# Altium footprint library Electronic Devices_LIB.PcbLib: 410 footprints (part 10 of 26)
Each footprint in its own frame and in the unit in brackets; x right, y up, seen from the top. Pads: shape width x height; smd on the part's side, far side on the other; paste and mask are expansions set on the pad; w line width, h text height; cw(c..) or ccw(c..) is an arc to the next point about the centre after c.
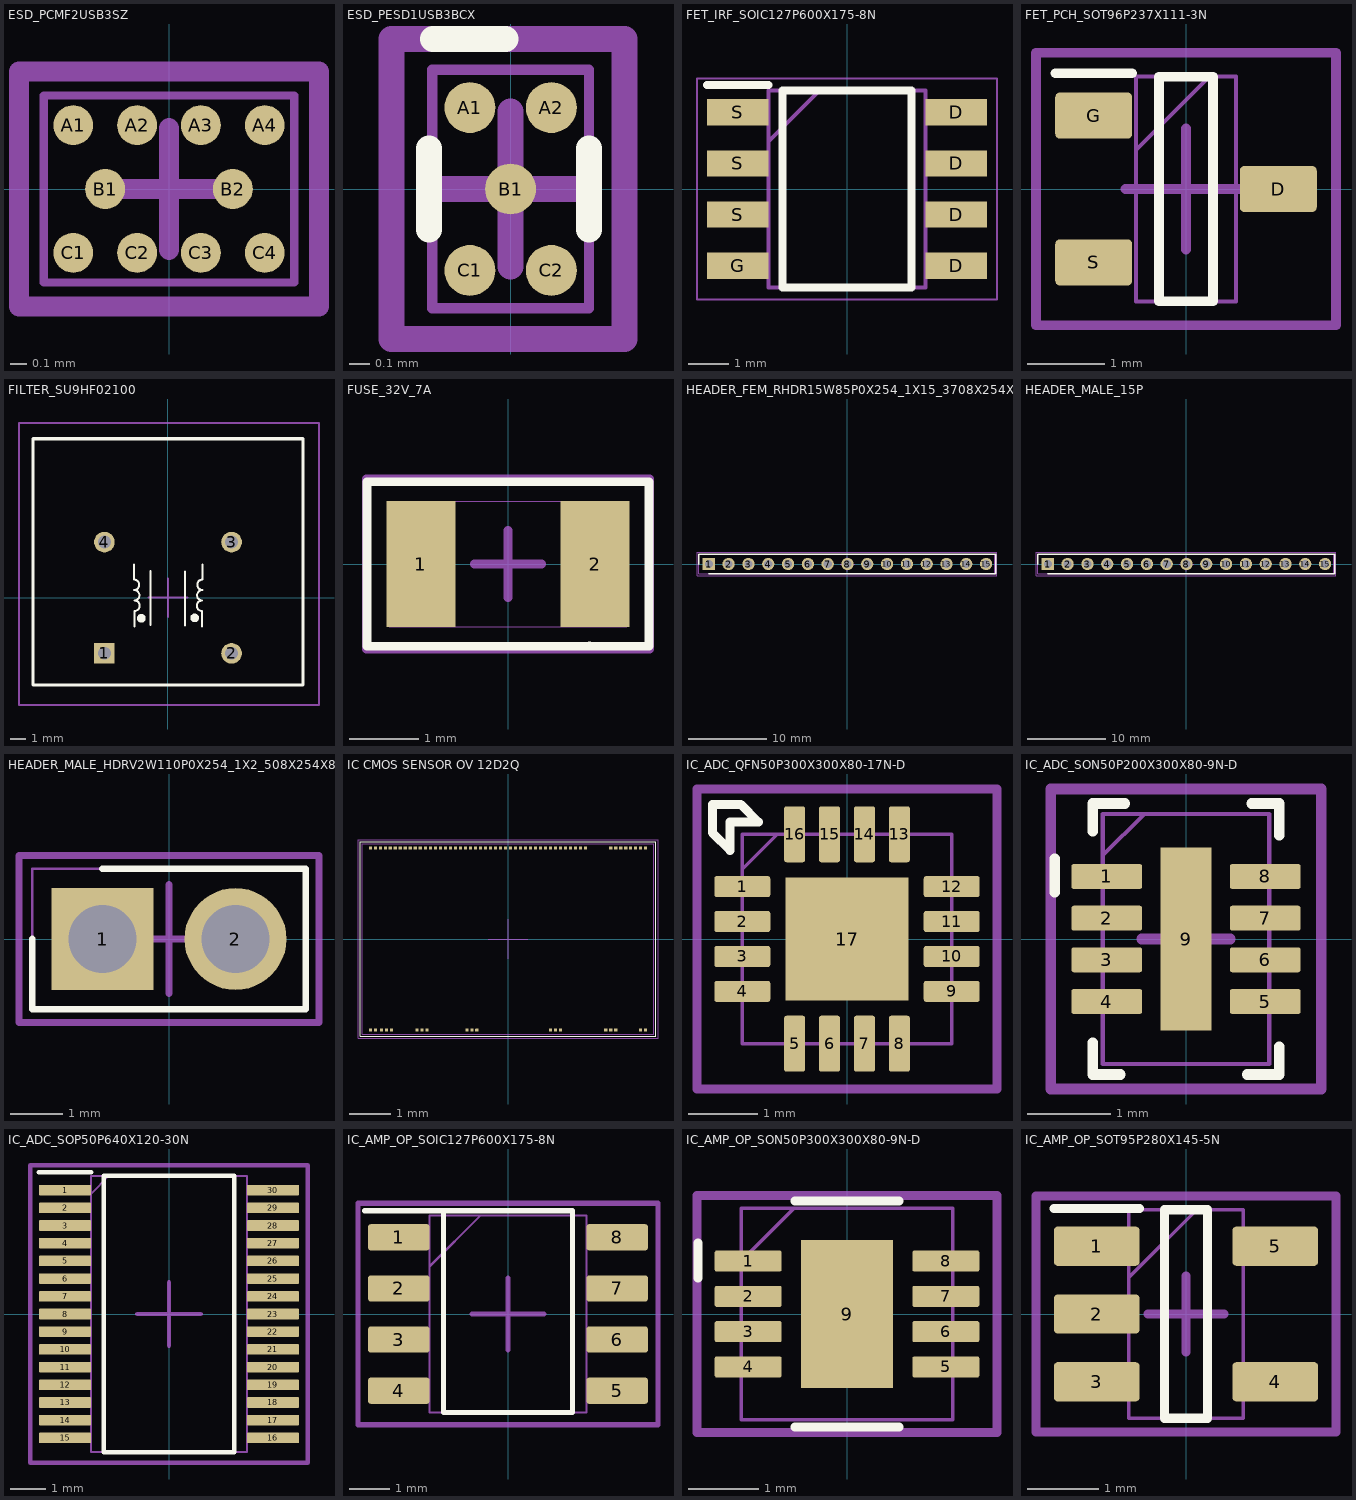
[diagram p9: the footprints below, top view; thin cyan lines are the x and y axes]

## ESD_PCMF2USB3SZ [mm]
pads (10):
  round 0.25 smd: A1(-0.6,0.4) A2(-0.2,0.4) A3(0.2,0.4) A4(0.6,0.4) B1(-0.4,0) B2(0.4,0) C1(-0.6,-0.4) C2(-0.2,-0.4) C3(0.2,-0.4) C4(0.6,-0.4)
Top Assembly:
  lines w0.051: -0.785,-0.585 0.785,-0.585 0.785,0.585 -0.785,0.585 -0.785,-0.585
  text ".Designator" at -2.388,-0.136 h0.51
Top Courtyard:
  lines w0.127: -0.381,0 0,0 ; 0,-0.381 0,0 ; 0,0.381 0,0 ; 0.381,0 0,0 ; -0.94,-0.737 -0.94,0.737 0.94,0.737 0.94,-0.737 -0.94,-0.737
3D body "PCMF2USB3SZ.stp": height 0.7, standoff 0, extent -0.785,-0.585 0.785,0.585

## ESD_PESD1USB3BCX [mm]
pads (5):
  round 0.25 smd: A1(-0.2,0.4) A2(0.2,0.4) B1(0,0) C1(-0.2,-0.4) C2(0.2,-0.4)
Top Overlay:
  lines w0.127: -0.4,-0.2 -0.4,0.2 ; -0.381,0.737 -0.025,0.737 ; 0.385,-0.2 0.385,0.2
Top Assembly:
  lines w0.051: -0.385,-0.585 0.385,-0.585 0.385,0.585 -0.385,0.585 -0.385,-0.585
  text ".Designator" at -2.388,-0.136 h0.51
Top Courtyard:
  lines w0.127: -0.381,0 0,0 ; 0,-0.381 0,0 ; 0,0.381 0,0 ; 0.381,0 0,0 ; -0.584,-0.737 0.559,-0.737 0.559,0.737 -0.584,0.737 -0.584,-0.737
3D body "PCMF1USB3SZ.stp": height 0.57, standoff 0, extent -0.385,-0.585 0.385,0.585

## FET_IRF_SOIC127P600X175-8N [mm]
pads (8):
  rect 1.525x0.65 smd: D(2.712,-1.905) D(2.712,-0.635) D(2.712,0.635) D(2.712,1.905) G(-2.712,-1.905) S(-2.712,-0.635) S(-2.712,0.635) S(-2.712,1.905)
Top Overlay:
  lines w0.2: -3.475,2.58 -1.95,2.58 ; -1.6,-2.45 -1.6,2.45 1.6,2.45 1.6,-2.45 -1.6,-2.45
Top 3D Body:
  lines w0.1: -1.95,1.18 -0.68,2.45 ; -1.95,-2.45 -1.95,2.45 1.95,2.45 1.95,-2.45 -1.95,-2.45
Mechanical 15:
  lines w0.05: -3.725,-2.75 -3.725,2.75 3.725,2.75 3.725,-2.75 -3.725,-2.75
3D body "NE555DR.stp": height 1.75, standoff 0, extent -3,-2.45 3,2.45

## FET_PCH_SOT96P237X111-3N [mm] "SOT-23-3 (TO-236)"
height 1.11
pads (3):
  rrect20% 1x0.6 smd: D(1.2,0) G(-1.2,0.955) S(-1.2,-0.955)
Top Overlay:
  lines w0.127: -1.7,1.505 -0.7,1.505 ; -0.35,-1.46 -0.35,1.46 0.35,1.46 0.35,-1.46 -0.35,-1.46
Top Assembly:
  lines w0.051: -0.65,0.505 0.305,1.46 ; -0.65,-1.46 -0.65,1.46 0.65,1.46 0.65,-1.46 -0.65,-1.46
  text ".Designator" at -2.438,-0.161 h0.51
Top Courtyard:
  lines w0.127: -0.787,0 0,0 ; 0,-0.787 0,0 ; 0,0.787 0,0 ; 0.787,0 0,0 ; -1.95,-1.77 -1.95,1.77 1.95,1.77 1.95,-1.77 -1.95,-1.77
3D body "NTR1P02T1G.stp": height 1.11, standoff 0, extent -1.185,-1.46 1.185,1.46

## FILTER_SU9HF02100 [mm]
pads (4):
  rect 1.3x1.3 hole 0.8: 1(-4,-3.5)
  round 1.3 hole 0.8: 2(4,-3.5) 3(4,3.5) 4(-4,3.5)
Top Overlay:
  circle w0.254: c-1.676,-1.295 r0.144
  circle w0.254: c1.676,-1.27 r0.144
  lines w0.127: -2.141,2.082 -2.141,1.142 cw(c-2.141,0.812) -2.125,0.482 cw(c-2.125,0.152) -2.108,-0.178 cw(c-2.108,-0.508) -2.092,-0.838 ; -2.108,-1.803 -2.108,-0.864 ; -1.092,-1.702 -1.092,1.676 ; 1.067,-1.74 1.067,1.638 ; 2.126,-0.837 cw(c2.143,-0.508) 2.143,-0.177 cw(c2.159,0.152) 2.159,0.483 cw(c2.175,0.812) 2.175,1.143 2.175,2.082 ; 2.143,-1.803 2.143,-0.863
  lines w0.2: -8.5,-5.5 -8.5,10 8.5,10 8.5,-5.5 -8.5,-5.5
Top Assembly:
  lines w0.051: -8.5,-5.5 8.5,-5.5 8.5,10 -8.5,10 -8.5,-5.5
  text ".Designator" at -2.654,0.784 h0.51
Top Courtyard:
  lines w0.127: -1.219,0 0,0 ; 0,-1.219 0,0 ; 0,1.219 0,0 ; 1.219,0 0,0 ; -9.373,-6.756 -9.373,11 9.5,11 9.5,-6.756 -9.373,-6.756
3D body "SU9HF-02100.stp": height 11.72, standoff -4.78, extent -8.499,-5.5 8.501,10.001

## FUSE_32V_7A [mil] "FUSE_3P4X1P8"
pads (2):
  rect 39x71 smd: 1(-49.21,0) 2(49.21,0)
Top Overlay:
  lines w5: 45.28,-46.44 79.71,-46.44 79.71,46.44 45.28,46.44 ; 46.06,-46.36 -79.71,-46.44 -79.71,46.44 47.83,46.46
Top Assembly:
  lines w0.01: -66.93,-35.43 66.93,-35.43 66.93,35.43 -66.93,35.43 -66.93,-35.43
  text ".Designator" at -103,-10.34 h20
Top Courtyard:
  lines w1: -10,0 10,0 ; 0,-10 0,10
  lines w5: -19,0 0,0 ; 0,-19 0,0 ; 0,19 0,0 ; 19,0 0,0 ; -80,-48 80,-48 80,48 -80,48 -80,-48
3D body "0440007.WR.stp": height 34.02, standoff 0, extent -62.56,-31.09 63.42,31.12

## HEADER_FEM_RHDR15W85P0X254_1X15_3708X254X850P [mm]
pads (15):
  rect 1.575x1.575 hole 1.05: 1(-17.78,0)
  round 1.575 hole 1.05: 2(-15.24,0) 3(-12.7,0) 4(-10.16,0) 5(-7.62,0) 6(-5.08,0) 7(-2.54,0) 8(0,0) 9(2.54,0) 10(5.08,0) 11(7.62,0) 12(10.16,0) 13(12.7,0) 14(15.24,0) 15(17.78,0)
Top Overlay:
  lines w0.2: -19.05,0 -19.05,1.27 18.999,1.27 18.999,-1.27 -17.78,-1.27
Top Assembly:
  lines w0.1: -19.05,-1.27 18.898,-1.27 18.898,1.27 -19.05,1.27 -19.05,-1.27
  text ".Designator" at -2.819,-0.237 h0.51
Top Courtyard:
  lines w0.127: -0.914,0 0,0 ; 0,-0.914 0,0 ; 0,0.914 0,0 ; 0.914,0 0,0 ; -19.3,-1.52 19.177,-1.52 19.177,1.52 -19.3,1.52 -19.3,-1.52
3D body "PPTC151LFBN-RC.stp": height 8.5, standoff -3.2, extent -18.54,-1.27 18.54,1.27

## HEADER_MALE_15P [mm]
pads (15):
  rect 1.575x1.575 hole 1.05: 1(-17.78,0)
  round 1.575 hole 1.05: 2(-15.24,0) 3(-12.7,0) 4(-10.16,0) 5(-7.62,0) 6(-5.08,0) 7(-2.54,0) 8(0,0) 9(2.54,0) 10(5.08,0) 11(7.62,0) 12(10.16,0) 13(12.7,0) 14(15.24,0) 15(17.78,0)
Top Overlay:
  lines w0.2: -19.05,0 -19.05,1.27 18.999,1.27 18.999,-1.27 -17.78,-1.27
Top Assembly:
  lines w0.1: -19.05,-1.27 -19.05,1.27 18.898,1.27 18.898,-1.27 -19.05,-1.27
  text ".Designator" at -2.819,-0.237 h0.51
Top Courtyard:
  lines w0.127: -0.914,0 0,0 ; 0,-0.914 0,0 ; 0,0.914 0,0 ; 0.914,0 0,0 ; -19.3,-1.52 -19.3,1.52 19.177,1.52 19.177,-1.52 -19.3,-1.52
3D body "PEC15SFAN.STEP": height 10.63, standoff -3.04, extent -19.05,-1.25 19.05,1.29

## HEADER_MALE_HDRV2W110P0X254_1X2_508X254X854P [mm]
pads (2):
  rect 1.95x1.95 hole 1.3: 1(-1.27,0)
  round 1.95 hole 1.3: 2(1.27,0)
Top Overlay:
  lines w0.127: -2.615,0 -2.615,-1.345 2.615,-1.345 2.615,1.345 -1.27,1.345
Top Assembly:
  lines w0.051: -2.615,-1.345 -2.615,1.345 2.615,1.345 2.615,-1.345 -2.615,-1.345
Top Courtyard:
  lines w0.127: -1.041,0 0,0 ; 0,-1.041 0,0 ; 0,1.041 0,0 ; 1.041,0 0,0 ; -2.865,-1.595 2.865,-1.595 2.865,1.595 -2.865,1.595 -2.865,-1.595
3D body "61300211121.stp": height 8.54, standoff -3.15, extent -2.54,-1.27 2.54,1.27

## IC CMOS SENSOR OV 12D2Q [mm]
pads (71):
  rrect20% 0.075x0.075 smd mask+0.025: 1(-3.31,2.19) 2(-3.19,2.19) 3(-3.07,2.19) 4(-2.95,2.19) 5(-2.83,2.19) 6(-2.71,2.19) 7(-2.59,2.19) 8(-2.47,2.19) 9(-2.35,2.19) 10(-2.23,2.19) 11(-2.11,2.19) 12(-1.98,2.19) 13(-1.86,2.19) 14(-1.74,2.19) 15(-1.62,2.19) 16(-1.5,2.19) 17(-1.38,2.19) 18(-1.26,2.19) 19(-1.14,2.19) 20(-1.02,2.19) 21(-0.9,2.19) 22(-0.78,2.19) 23(-0.66,2.19) 24(-0.54,2.19) 25(-0.42,2.19) 26(-0.3,2.19) 27(-0.18,2.19) 28(-0.06,2.19) 29(0.06,2.19) 30(0.18,2.19) 31(0.3,2.19) 32(0.42,2.19) 33(0.54,2.19) 34(0.66,2.19) 35(0.78,2.19) 36(0.9,2.19) 37(1.02,2.19) 38(1.14,2.19) 39(1.26,2.19) 40(1.38,2.19) 41(1.5,2.19) 42(1.62,2.19) 43(1.74,2.19) 44(1.86,2.19) 45(2.47,2.19) 46(2.59,2.19) 47(2.71,2.19) 48(2.83,2.19) 49(2.95,2.19) 50(3.07,2.19) 51(3.19,2.19) 52(3.31,2.19) 53(3.31,-2.19) 54(3.19,-2.19) 55(2.59,-2.19) 56(2.47,-2.19) 57(2.35,-2.19) 58(1.26,-2.19) 59(1.14,-2.19) 60(1.02,-2.19) 61(-0.75,-2.19) 62(-0.87,-2.19) 63(-0.99,-2.19) 64(-1.95,-2.19) 65(-2.07,-2.19) 66(-2.19,-2.19) 67(-2.8,-2.19) 68(-2.92,-2.19) 69(-3.04,-2.19) 70(-3.19,-2.19) 71(-3.31,-2.19)
Top Overlay:
  lines w0.025: -3.556,-2.337 -3.556,2.337 3.556,2.337 3.556,-2.337 -3.556,-2.337
Top Assembly:
  lines w0.025: -3.51,-2.29 3.51,-2.29 3.51,2.29 -3.51,2.29 -3.51,-2.29
  text ".Designator" at -2.589,-0.14 h0.51
Top Courtyard:
  lines w0.025: -0.48,0 0,0 ; 0,-0.48 0,0 ; 0,0.48 0,0 ; 0.48,0 0,0 ; -3.607,-2.388 -3.607,2.388 3.607,2.388 3.607,-2.388 -3.607,-2.388

## IC_ADC_QFN50P300X300X80-17N-D [mm]
pads (17):
  rrect20% 0.8x0.3 smd: 1(-1.5,0.75) 2(-1.5,0.25) 3(-1.5,-0.25) 4(-1.5,-0.75) 9(1.5,-0.75) 10(1.5,-0.25) 11(1.5,0.25) 12(1.5,0.75)
  rrect20% 0.3x0.8 smd: 5(-0.75,-1.5) 6(-0.25,-1.5) 7(0.25,-1.5) 8(0.75,-1.5) 13(0.75,1.5) 14(0.25,1.5) 15(-0.25,1.5) 16(-0.75,1.5)
  rect 1.76x1.76 smd: 17(0,0)
Top Overlay:
  lines w0.127: -1.93,1.524 -1.676,1.27 -1.676,1.676 -1.27,1.676 -1.524,1.93 -1.93,1.93 -1.93,1.524
Top Assembly:
  lines w0.051: -1.5,1 -1,1.5 ; -1.5,-1.5 1.5,-1.5 1.5,1.5 -1.5,1.5 -1.5,-1.5
  text ".Designator" at -2.515,-0.161 h0.51
Top Courtyard:
  lines w0.127: -2.15,-2.15 2.15,-2.15 2.15,2.15 -2.15,2.15 -2.15,-2.15
3D body "ADS7924IRTER.stp": height 0.8, standoff 0, extent -1.5,-1.5 1.5,1.5

## IC_ADC_SON50P200X300X80-9N-D [mm] "TSOT-23"
height 1
pads (9):
  rrect20% 0.85x0.3 smd: 1(-0.95,0.75) 2(-0.95,0.25) 3(-0.95,-0.25) 4(-0.95,-0.75) 5(0.95,-0.75) 6(0.95,-0.25) 7(0.95,0.25) 8(0.95,0.75)
  rect 0.61x2.2 smd: 9(0,0)
Top Overlay:
  lines w0.127: -1.575,0.559 -1.575,0.965 ; -1.118,-1.245 -1.118,-1.626 -0.787,-1.626 ; -1.118,1.295 -1.118,1.626 -0.737,1.626 ; 0.737,-1.626 1.118,-1.626 1.118,-1.295 ; 0.787,1.626 1.118,1.626 1.118,1.245
Top Assembly:
  lines w0.051: -1,1 -0.5,1.5 ; -1,-1.5 1,-1.5 1,1.5 -1,1.5 -1,-1.5
  text ".Designator" at -2.591,-0.059 h0.51
Top Courtyard:
  lines w0.127: -0.533,0 0,0 ; 0,-0.533 0,0 ; 0,0.533 0,0 ; 0.533,0 0,0 ; -1.625,-1.8 1.625,-1.8 1.625,1.8 -1.625,1.8 -1.625,-1.8
3D body "LTC2451CDDB#TRMPBF.stp": height 0.8, standoff 0, extent -1.05,-1.5 1.05,1.5

## IC_ADC_SOP50P640X120-30N [mm]
pads (30):
  rrect20% 1.475x0.3 smd: 1(-2.938,3.5) 2(-2.938,3) 3(-2.938,2.5) 4(-2.938,2) 5(-2.938,1.5) 6(-2.938,1) 7(-2.938,0.5) 8(-2.938,0) 9(-2.938,-0.5) 10(-2.938,-1) 11(-2.938,-1.5) 12(-2.938,-2) 13(-2.938,-2.5) 14(-2.938,-3) 15(-2.938,-3.5) 16(2.938,-3.5) 17(2.938,-3) 18(2.938,-2.5) 19(2.938,-2) 20(2.938,-1.5) 21(2.938,-1) 22(2.938,-0.5) 23(2.938,0) 24(2.938,0.5) 25(2.938,1) 26(2.938,1.5) 27(2.938,2) 28(2.938,2.5) 29(2.938,3) 30(2.938,3.5)
Top Overlay:
  lines w0.127: -3.675,4 -2.2,4 ; -1.85,-3.9 -1.85,3.9 1.85,3.9 1.85,-3.9 -1.85,-3.9
Top Assembly:
  lines w0.051: -2.2,3.4 -1.7,3.9 ; -2.2,-3.9 -2.2,3.9 2.2,3.9 2.2,-3.9 -2.2,-3.9
  text ".Designator" at -2.349,-0.38 h0.51
Top Courtyard:
  lines w0.127: -0.9,0 0,0 ; 0,-0.9 0,0 ; 0,0.9 0,0 ; 0.9,0 0,0 ; -3.925,-4.2 -3.925,4.2 3.925,4.2 3.925,-4.2 -3.925,-4.2
3D body "PCM1865DBTR.stp": height 1.13, standoff 0, extent -3.2,-3.9 3.2,3.9

## IC_AMP_OP_SOIC127P600X175-8N [mm] "8-SOIC (0.154\", 3.90mm Width)"
height 1.2
pads (8):
  rrect20% 1.525x0.65 smd: 1(-2.712,1.905) 2(-2.712,0.635) 3(-2.712,-0.635) 4(-2.712,-1.905) 5(2.712,-1.905) 6(2.712,-0.635) 7(2.712,0.635) 8(2.712,1.905)
Top Overlay:
  lines w0.127: -3.556,2.565 -1.6,2.565 ; -1.6,2.565 -1.6,-2.45 1.6,-2.45 1.6,2.565 -1.6,2.565
Top Assembly:
  lines w0.051: -1.95,1.18 -0.68,2.45 ; -1.95,-2.45 -1.95,2.45 1.95,2.45 1.95,-2.45 -1.95,-2.45
  text ".Designator" at -2.591,-0.263 h0.51
Top Courtyard:
  lines w0.127: -0.889,0 0,0 ; 0,-0.889 0,0 ; 0,0.889 0,0 ; 0.889,0 0,0 ; -3.725,-2.75 -3.725,2.75 3.725,2.75 3.725,-2.75 -3.725,-2.75
3D body "NE555DR.stp": height 1.75, standoff 0, extent -3,-2.45 3,2.45

## IC_AMP_OP_SON50P300X300X80-9N-D [mm] "8-WFDFN Exposed Pad"
height 0.8
pads (9):
  rrect20% 0.95x0.3 smd: 1(-1.4,0.75) 2(-1.4,0.25) 3(-1.4,-0.25) 4(-1.4,-0.75) 5(1.4,-0.75) 6(1.4,-0.25) 7(1.4,0.25) 8(1.4,0.75)
  rect 1.3x2.1 smd: 9(0,0)
Top Overlay:
  lines w0.127: -2.108,0.508 -2.108,1.008 ; -0.737,-1.6 0.737,-1.6 ; -0.737,1.6 0.737,1.6
Top Assembly:
  lines w0.051: -1.5,0.75 -0.75,1.5 ; -1.5,-1.5 -1.5,1.5 1.5,1.5 1.5,-1.5 -1.5,-1.5
Top Courtyard:
  lines w0.127: -0.508,0 0,0 ; 0,-0.508 0,0 ; 0,0.508 0,0 ; 0.508,0 0,0 ; -2.125,-1.676 -2.125,1.676 2.125,1.676 2.125,-1.676 -2.125,-1.676
3D body "OPA1612AIDRGR.stp": height 0.75, standoff 0, extent -1.5,-1.5 1.5,1.5

## IC_AMP_OP_SOT95P280X145-5N [mm] "SOT-23-5"
height 1.1
pads (5):
  rrect20% 1.2x0.55 smd: 1(-1.25,0.95) 2(-1.25,0) 3(-1.25,-0.95) 4(1.25,-0.95) 5(1.25,0.95)
Top Overlay:
  lines w0.127: -1.85,1.475 -0.65,1.475 ; -0.3,-1.46 0.3,-1.46 0.3,1.46 -0.3,1.46 -0.3,-1.46
Top Assembly:
  lines w0.051: -0.8,0.51 0.15,1.46 ; -0.8,-1.46 0.8,-1.46 0.8,1.46 -0.8,1.46 -0.8,-1.46
  text ".Designator" at -2.464,-0.161 h0.51
Top Courtyard:
  lines w0.127: -0.533,0 0,0 ; 0,-0.533 0,0 ; 0,0.533 0,0 ; 0.533,0 0,0 ; -2.1,-1.651 2.1,-1.651 2.1,1.651 -2.1,1.651 -2.1,-1.651
3D body "AP2202K-3.3TRG1.stp": height 1.45, standoff 0, extent -1.4,-1.46 1.4,1.46